# Altium footprint library ESKDPcbLib.PcbLib: 608 footprints (part 29 of 38)
Each footprint in its own frame and in the unit in brackets; x right, y up, seen from the top. Pads: shape width x height; smd on the part's side, far side on the other; paste and mask are expansions set on the pad; w line width, h text height; cw(c..) or ccw(c..) is an arc to the next point about the centre after c.
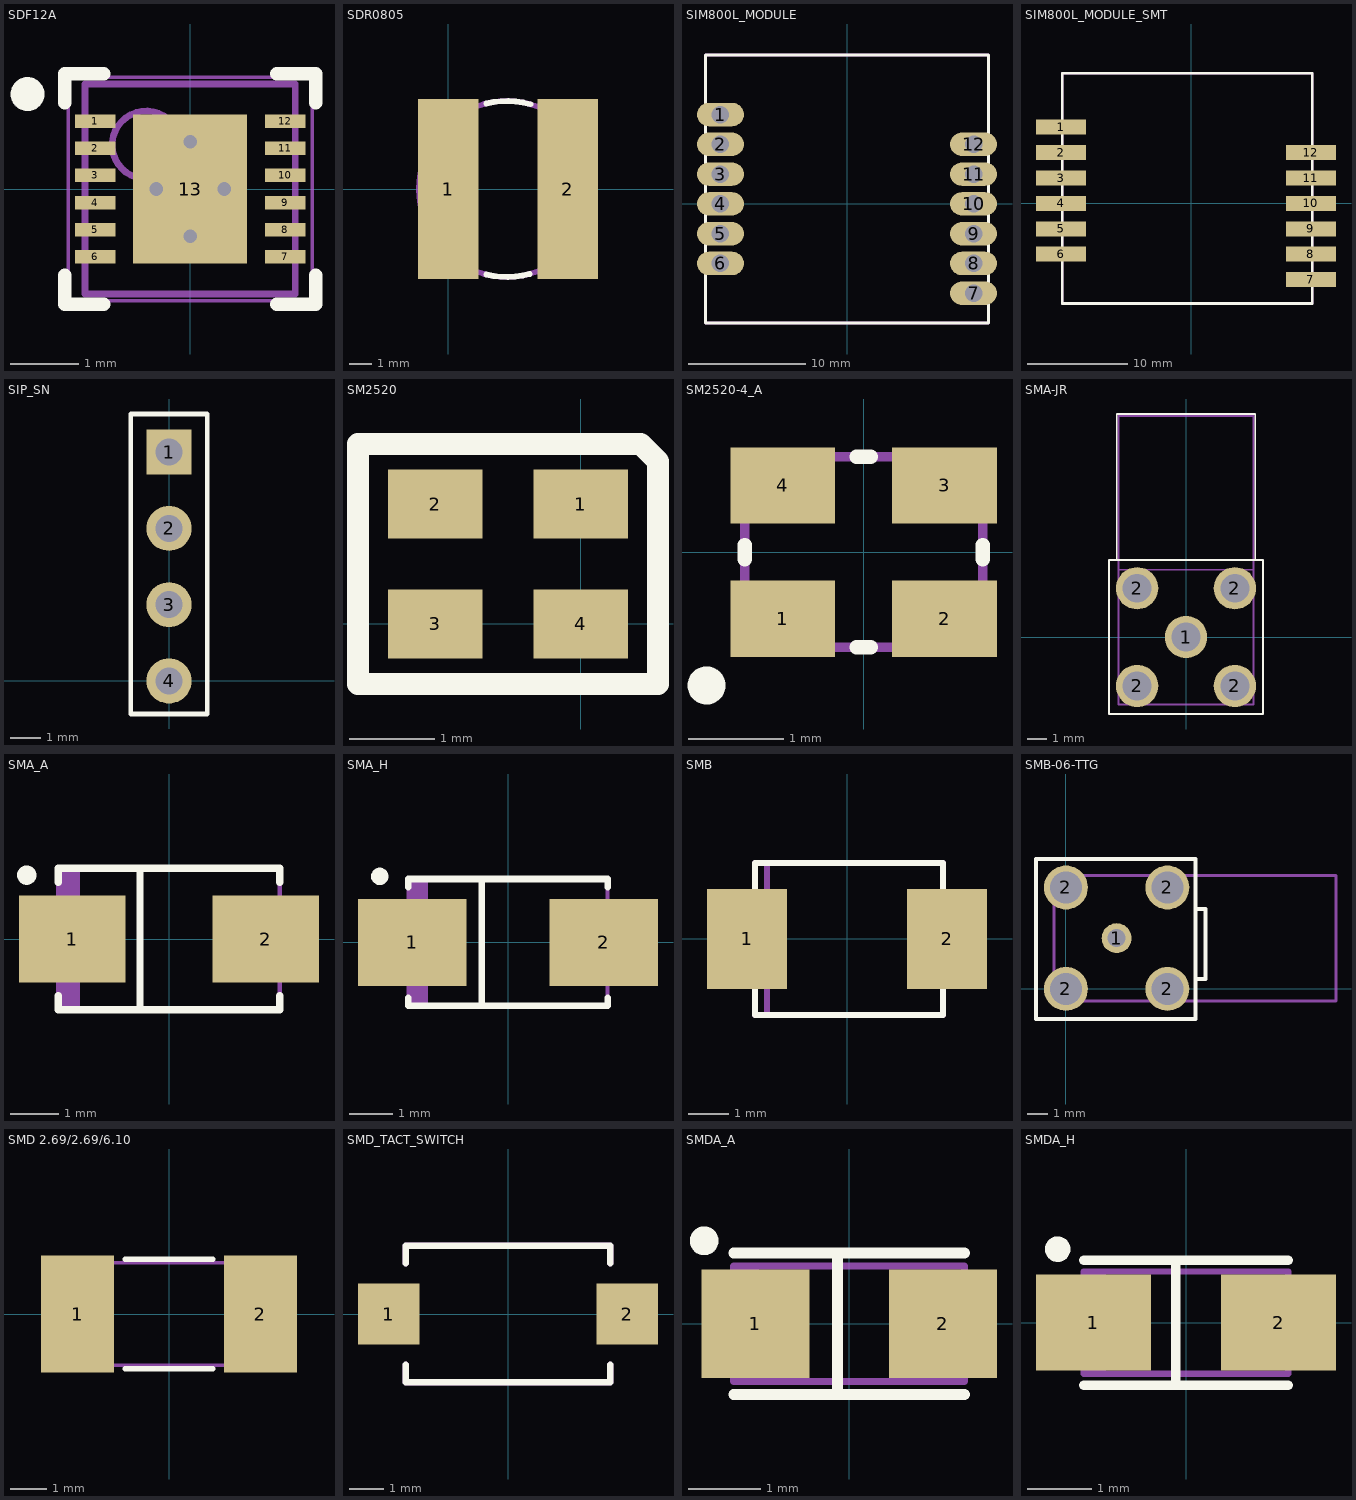
[diagram p28: the footprints below, top view; thin cyan lines are the x and y axes]

## SDF12A [mm] "SON, 12-Leads, Body 3x3mm, Pitch 0.4mm, NSC Recommended"
height 0.8
pads (13):
  rect 0.6x0.2 smd paste-0.125 mask+0.051: 1(-1.4,1) 2(-1.4,0.6) 3(-1.4,0.2) 4(-1.4,-0.2) 5(-1.4,-0.6) 6(-1.4,-1) 7(1.4,-1) 8(1.4,-0.6) 9(1.4,-0.2) 10(1.4,0.2) 11(1.4,0.6) 12(1.4,1)
  rect 1.68x2.2 smd paste-0.05 mask+0.051: 13(0,0)
via 0,-0.7 diameter 0.5 hole 0.2
via 0,0.7 diameter 0.5 hole 0.2
via 0.5,0 diameter 0.5 hole 0.2
via -0.5,0 diameter 0.5 hole 0.2
Top Overlay:
  circle w0.25: c-2.4,1.4 r0.125
  lines w0.2: -1.85,-1.275 -1.85,-1.7 -1.275,-1.7 ; -1.85,1.275 -1.85,1.7 -1.275,1.7 ; 1.275,-1.7 1.85,-1.7 1.85,-1.275 ; 1.275,1.7 1.85,1.7 1.85,1.275
Top Paste:
  rectangle: -1.9,0.9 -1.2,1.1
  rectangle: -1.9,0.5 -1.2,0.7
  rectangle: -1.9,0.1 -1.2,0.3
  rectangle: -1.9,-0.3 -1.2,-0.1
  rectangle: -1.9,-0.7 -1.2,-0.5
  rectangle: -1.9,-1.1 -1.2,-0.9
  region: 1.9,-0.9 1.2,-0.9 1.2,-1.1 1.9,-1.1
  region: 1.9,-0.5 1.2,-0.5 1.2,-0.7 1.9,-0.7
  region: 1.9,-0.1 1.2,-0.1 1.2,-0.3 1.9,-0.3
  region: 1.9,0.3 1.2,0.3 1.2,0.1 1.9,0.1
  region: 1.9,0.7 1.2,0.7 1.2,0.5 1.9,0.5
  region: 1.9,1.1 1.2,1.1 1.2,0.9 1.9,0.9
Mechanical 13:
  circle w0.1: c-0.65,0.65 r0.5
  lines w0.1: -1.55,-1.55 -1.55,1.55 1.55,1.55 1.55,-1.55 -1.55,-1.55
Mechanical 15:
  lines w0.05: -1.8,-1.65 -1.8,1.65 1.8,1.65 1.8,-1.65 -1.8,-1.65
  lines w0.1: -0.5,0 0.5,0 ; 0,-0.5 0,0.5
3D body: height 0.8, standoff 0, extent -1.55,-1.55 1.55,1.55

## SDR0805 [mm]
pads (2):
  rect 2.7x8 smd: 1(0,0) 2(5.3,0)
Top Overlay:
  lines w0.254: 1.683,3.791 cw(c2.6,0) 3.648,3.757 ; 1.69,-3.792 ccw(c2.6,0) 3.616,-3.765
Mechanical 7:
  circle w0.254: c2.6,0 r3.9
Mechanical 10:
  text ".Designator" at 0.175,5.575 h1
  text ".Comment" at 0.15,4.5 h1
3D body: height 5.3, standoff 0, extent -1.269,-3.892 6.5,3.892

## SIM800L_MODULE [mm]
pads (12):
  oval 4x2 hole 1.5: 1(-10.795,7.62) 2(-10.795,5.08) 3(-10.795,2.54) 4(-10.795,0) 5(-10.795,-2.54) 6(-10.795,-5.08) 7(10.795,-7.62) 8(10.795,-5.08) 9(10.795,-2.54) 10(10.795,0) 11(10.795,2.54) 12(10.795,5.08)
Top Overlay:
  lines w0.254: -12.065,-10.16 -12.065,12.7 12.065,12.7 12.065,-10.16 -12.065,-10.16
Mechanical 7:
  lines w0.254: -12.065,-10.16 -12.065,12.7 12.065,12.7 12.065,-10.16 -12.065,-10.16
Mechanical 10:
  text ".Comment" at -11.705,13.2 h1
  text ".Designator" at -11.705,14.2 h1
3D body "PLS-1.STEP": height 5.6, standoff -5.84, extent 9.525,-8.89 12.065,-6.35
3D body "PLS-1.STEP": height 5.6, standoff -5.84, extent 9.525,-6.35 12.065,-3.81
3D body "PLS-1.STEP": height 5.6, standoff -5.84, extent 9.525,-3.81 12.065,-1.27
3D body "PLS-1.STEP": height 5.6, standoff -5.84, extent 9.525,-1.27 12.065,1.27
3D body "PLS-1.STEP": height 5.6, standoff -5.84, extent 9.525,1.27 12.065,3.81
3D body "PLS-1.STEP": height 5.6, standoff -5.84, extent 9.525,3.81 12.065,6.35
3D body "PLS-1.STEP": height 5.6, standoff -5.84, extent -12.065,-6.35 -9.525,-3.81
3D body "PLS-1.STEP": height 5.6, standoff -5.84, extent -12.065,-3.81 -9.525,-1.27
3D body "PLS-1.STEP": height 5.6, standoff -5.84, extent -12.065,-1.27 -9.525,1.27
3D body "PLS-1.STEP": height 5.6, standoff -5.84, extent -12.065,1.27 -9.525,3.81
3D body "PLS-1.STEP": height 5.6, standoff -5.84, extent -12.065,3.81 -9.525,6.35
3D body "PLS-1.STEP": height 5.6, standoff -5.84, extent -12.065,6.35 -9.525,8.89

## SIM800L_MODULE_SMT [mm]
pads (12):
  rect 5x1.5 smd: 1(-13,7.62) 2(-13,5.08) 3(-13,2.54) 4(-13,0) 5(-13,-2.54) 6(-13,-5.08) 7(12,-7.62) 8(12,-5.08) 9(12,-2.54) 10(12,0) 11(12,2.54) 12(12,5.08)
Top Overlay:
  lines w0.254: -12.852,-10.008 11.303,-10.008 12.141,-10.008 12.141,13.005 -12.852,13.005 -12.852,-10.008
Mechanical 7:
  lines w0.254: -12.865,-10 12.135,-10 12.135,13 -12.865,13 -12.865,-10
Mechanical 10:
  text ".Designator" at 13.06,11.66 h1
  text ".Comment" at 13.06,10.66 h1
3D body "PLS-1R.STEP": height 8.5, standoff 0.05, extent 8.89,-8.89 17.51,-6.35
3D body "PLS-1R.STEP": height 8.5, standoff 0.05, extent 8.89,-6.35 17.51,-3.81
3D body "PLS-1R.STEP": height 8.5, standoff 0.05, extent 8.89,-3.81 17.51,-1.27
3D body "PLS-1R.STEP": height 8.5, standoff 0.05, extent 8.89,-1.27 17.51,1.27
3D body "PLS-1R.STEP": height 8.5, standoff 0.05, extent 8.89,1.27 17.51,3.81
3D body "PLS-1R.STEP": height 8.5, standoff 0.05, extent 8.89,3.81 17.51,6.35
3D body "PLS-1R.STEP": height 8.5, standoff 0.05, extent -18.78,-6.35 -10.16,-3.81
3D body "PLS-1R.STEP": height 8.5, standoff 0.05, extent -18.78,-3.81 -10.16,-1.27
3D body "PLS-1R.STEP": height 8.5, standoff 0.05, extent -18.78,-1.27 -10.16,1.27
3D body "PLS-1R.STEP": height 8.5, standoff 0.05, extent -18.78,1.27 -10.16,3.81
3D body "PLS-1R.STEP": height 8.5, standoff 0.05, extent -18.78,3.81 -10.16,6.35
3D body "PLS-1R.STEP": height 8.5, standoff 0.05, extent -18.78,6.35 -10.16,8.89

## SIP_SN [mm]
pads (4):
  rect 1.5x1.5 hole 0.9: 1(0,7.62)
  round 1.5 hole 0.9: 2(0,5.08) 3(0,2.54) 4(0,0)
Top Overlay:
  lines w0.15: -1.27,-1.1 1.27,-1.1 1.27,8.89 -1.27,8.89 -1.27,-1.1
Mechanical 7:
  lines w0.1: -1.27,-1.1 1.27,-1.1 1.27,8.89 -1.27,8.89 -1.27,-1.1
Mechanical 10:
  text ".Comment" at -0.31,9.4 h0.6
  text ".Designator" at -0.42,10.13 h0.8
3D body: height 15, standoff 0, extent -1.27,-1.1 1.27,8.89

## SM2520 [mm]
pads (4):
  rect 1.1x0.8 smd: 1(0,1.4) 2(-1.7,1.4) 3(-1.7,0) 4(0,0)
Top Overlay:
  lines w0.254: -2.6,-0.7 0.9,-0.7 0.9,1.9 0.7,2.1 -2.6,2.1 -2.6,-0.7
3D body: height 1, standoff 0, extent -2.6,-0.7 0.9,2.1

## SM2520-4_A [mm]
height 1
pads (4):
  rect 1.1x0.8 smd: 1(-0.85,-0.7) 2(0.85,-0.7) 3(0.85,0.7) 4(-0.85,0.7)
Top Overlay:
  circle w0.2: c-1.65,-1.4 r0.1
  lines w0.15: -1.25,-0.075 -1.25,0.075 ; -0.075,-1 0.075,-1 ; -0.075,1 0.075,1 ; 1.25,-0.075 1.25,0.075
Mechanical 7:
  lines w0.1: -1.25,-1 1.25,-1 1.25,1 -1.25,1 -1.25,-1
Mechanical 10:
  text ".Comment" at -1,-1.725 h0.6
  text ".Designator" at -0.775,1.6 h0.8
3D body: height 1, standoff 0, extent -1.25,-1 1.25,1

## SMA-JR [mm]
pads (5):
  round 2.2 hole 1.5: 1(0,0) 2(-2.54,-2.54) 2(-2.54,2.54) 2(2.54,-2.54) 2(2.54,2.54)
Top Overlay:
  lines w0.1: -3.6,4 -3.6,11.6 3.6,11.6 3.6,4 ; -4,-4 4,-4 4,4 -4,4 -4,-4
Mechanical 7:
  lines w0.1: -3.5,3.5 -3.5,11.5 3.5,11.5 3.5,3.5 ; -3.5,3.5 3.5,3.5 ; -3.5,3.5 -3.5,-3.5 3.5,-3.5 3.5,3.5
Mechanical 10:
  text ".Comment" at -0.875,4.45 h0.6
  text ".Designator" at -1.35,5.1 h0.8
3D body: height 10, standoff 0.1, extent -3.5,-3.5 3.5,3.5
3D body: height 9.49, standoff 2.51, extent -3.472,3.5 3.5,11.5

## SMA_A [mm]
height 2.67
pads (2):
  rect 2.2x1.8 smd: 1(-2,0) 2(2,0)
Top Overlay:
  circle w0.2: c-2.94,1.32 r0.1
  lines w0.15: -2.29,-1.17 -2.29,-1.46 2.29,-1.46 2.29,-1.17 ; -2.29,1.17 -2.29,1.46 2.29,1.46 2.29,1.17 ; -0.6,-1.45 -0.6,1.45
Mechanical 7:
  lines w0.1: -2.29,-0.82 -2.8,-0.82 -2.8,0.82 -2.29,0.82 ; -2.19,-1.44 -2.19,1.46 ; -2.09,-1.44 -2.09,1.46 ; -1.99,-1.44 -1.99,1.46 ; -1.89,-1.44 -1.89,1.46 ; 2.29,-0.82 2.8,-0.82 2.8,0.82 2.29,0.82 ; -2.29,-1.46 -2.29,1.46 2.29,1.46 2.29,-1.46 -2.29,-1.46
Mechanical 10:
  text ".Comment" at -0.88,-2.11 h0.6
  text ".Designator" at -1.12,1.81 h0.8
3D body "SMA.STEP": height 2.4, standoff 0, extent -2.8,-1.45 2.8,1.45

## SMA_H [mm]
height 2.67
pads (2):
  rect 2.5x2 smd: 1(-2.2,0) 2(2.2,0)
Top Overlay:
  circle w0.2: c-2.95,1.52 r0.1
  lines w0.15: -2.29,-1.27 -2.29,-1.46 2.29,-1.46 2.29,-1.27 ; -2.29,1.27 -2.29,1.46 2.29,1.46 2.29,1.27 ; -0.6,-1.45 -0.6,1.45
Mechanical 7:
  lines w0.1: -2.29,-0.82 -2.8,-0.82 -2.8,0.82 -2.29,0.82 ; -2.19,-1.44 -2.19,1.46 ; -2.09,-1.44 -2.09,1.46 ; -1.99,-1.44 -1.99,1.46 ; -1.89,-1.44 -1.89,1.46 ; 2.29,-0.82 2.8,-0.82 2.8,0.82 2.29,0.82 ; -2.29,-1.46 -2.29,1.46 2.29,1.46 2.29,-1.46 -2.29,-1.46
Mechanical 10:
  text ".Comment" at -0.88,-2.11 h0.6
  text ".Designator" at -1.12,1.81 h0.8
3D body "SMA.STEP": height 2.4, standoff 0, extent -2.8,-1.45 2.8,1.45

## SMB [mm]
pads (2):
  rect 2x2.5 smd: 1(-2.5,0) 2(2.5,0)
Top Overlay:
  lines w0.15: -2.3,-1.9 2.4,-1.9 2.4,1.9 -2.3,1.9 -2.3,-1.9
Mechanical 7:
  lines w0.15: -2,-1.9 -2,1.9 ; -2.3,-1.9 2.4,-1.9 2.4,1.9 -2.3,1.9 -2.3,-1.9
Mechanical 10:
  text ".Designator" at -3.1,3.8 h1.5
  text ".Comment" at -3.1,2.45 h1.5
3D body: height 2.4, standoff 0, extent -2.75,-1.9 2.85,1.9

## SMB-06-TTG [mm]
pads (5):
  round 1.5 hole 0.9: 1(2.54,2.54)
  round 2.2 hole 1.6: 2(0,0) 2(0,5.08) 2(5.08,0) 2(5.08,5.08)
Top Overlay:
  lines w0.2: 6.5,0.5 7,0.5 7,4 6.5,4 ; -1.5,-1.5 -1.5,6.5 6.5,6.5 6.5,-1.5 -1.5,-1.5
Mechanical 7:
  lines w0.15: 13.525,5.675 -0.6,5.675 -0.6,-0.6 13.525,-0.6 13.525,5.675 ; 13.525,5.675 13.525,5.675
Mechanical 10:
  text ".Designator" at -0.35,7.05 h1
  text ".Comment" at -0.25,7.9 h1
3D body: height 8.65, standoff -3.91, extent -0.61,-0.61 13.54,5.69

## SMD 2.69/2.69/6.10 [mm]
pads (2):
  rect 2x3.2 smd: 1(-2.5,0) 2(2.5,0)
Top Overlay:
  lines w0.15: -1.2,-1.5 1.2,-1.5 ; -1.2,1.5 1.2,1.5
Mechanical 7:
  lines w0.1: -3.1,-1.4 3.1,-1.4 3.1,1.4 -3.1,1.4 -3.1,-1.4
3D body: height 2.69, standoff 0, extent -3.1,-1.4 3.1,1.4

## SMD_TACT_SWITCH [mm]
height 2.5
pads (2):
  rect 1.8x1.8 smd: 1(-3.5,0) 2(3.5,0)
Top Overlay:
  lines w0.2: -3,-1.5 -3,-2 3,-2 3,-1.5 ; -3,1.5 -3,2 3,2 3,1.5
Mechanical 7:
  lines w0.2: -3,-1.5 -3,-2 3,-2 3,-1.5 ; -3,1.5 -3,2 3,2 3,1.5
Mechanical 10:
  text ".Comment" at 0.5,-3 h0.6
  text ".Designator" at -0.5,2.5 h0.8
3D body: height 2.5, standoff 0, extent -4,-1.8 4,1.8

## SMDA_A [mm]
height 1.6
pads (2):
  rect 1.5x1.5 smd: 1(-1.3,0) 2(1.3,0)
Top Overlay:
  circle w0.2: c-2.01,1.15 r0.1
  lines w0.15: -1.6,-0.98 1.6,-0.98 ; -1.6,0.98 1.6,0.98 ; -0.16,-0.98 -0.16,0.98
Mechanical 7:
  lines w0.1: -1.5,-0.8 -1.5,0.8 ; -1.4,-0.8 -1.4,0.8 ; -1.3,-0.8 -1.3,0.8 ; -1.6,-0.8 1.6,-0.8 1.6,0.8 -1.6,0.8 -1.6,-0.8
Mechanical 10:
  text ".Comment" at -0.88,-1.58 h0.6
  text ".Designator" at -0.84,1.25 h0.8
3D body: height 1.6, standoff 0, extent -1.6,-0.8 1.6,0.8

## SMDA_H [mm]
height 1.6
pads (2):
  rect 1.8x1.5 smd: 1(-1.45,0) 2(1.45,0)
Top Overlay:
  circle w0.2: c-2.01,1.15 r0.1
  lines w0.15: -1.6,-0.98 1.6,-0.98 ; -1.6,0.98 1.6,0.98 ; -0.16,-0.98 -0.16,0.98
Mechanical 7:
  lines w0.1: -1.5,-0.8 -1.5,0.8 ; -1.4,-0.8 -1.4,0.8 ; -1.3,-0.8 -1.3,0.8 ; -1.6,-0.8 1.6,-0.8 1.6,0.8 -1.6,0.8 -1.6,-0.8
Mechanical 10:
  text ".Comment" at -0.92,-1.56 h0.6
  text ".Designator" at -0.84,1.25 h0.8
3D body: height 1.6, standoff 0, extent -1.6,-0.8 1.6,0.8